# Altium footprint library jointbar.PCBLIB: 166 footprints (part 3 of 11)
Each footprint in its own frame and in the unit in brackets; x right, y up, seen from the top. Pads: shape width x height; smd on the part's side, far side on the other; paste and mask are expansions set on the pad; w line width, h text height; cw(c..) or ccw(c..) is an arc to the next point about the centre after c.
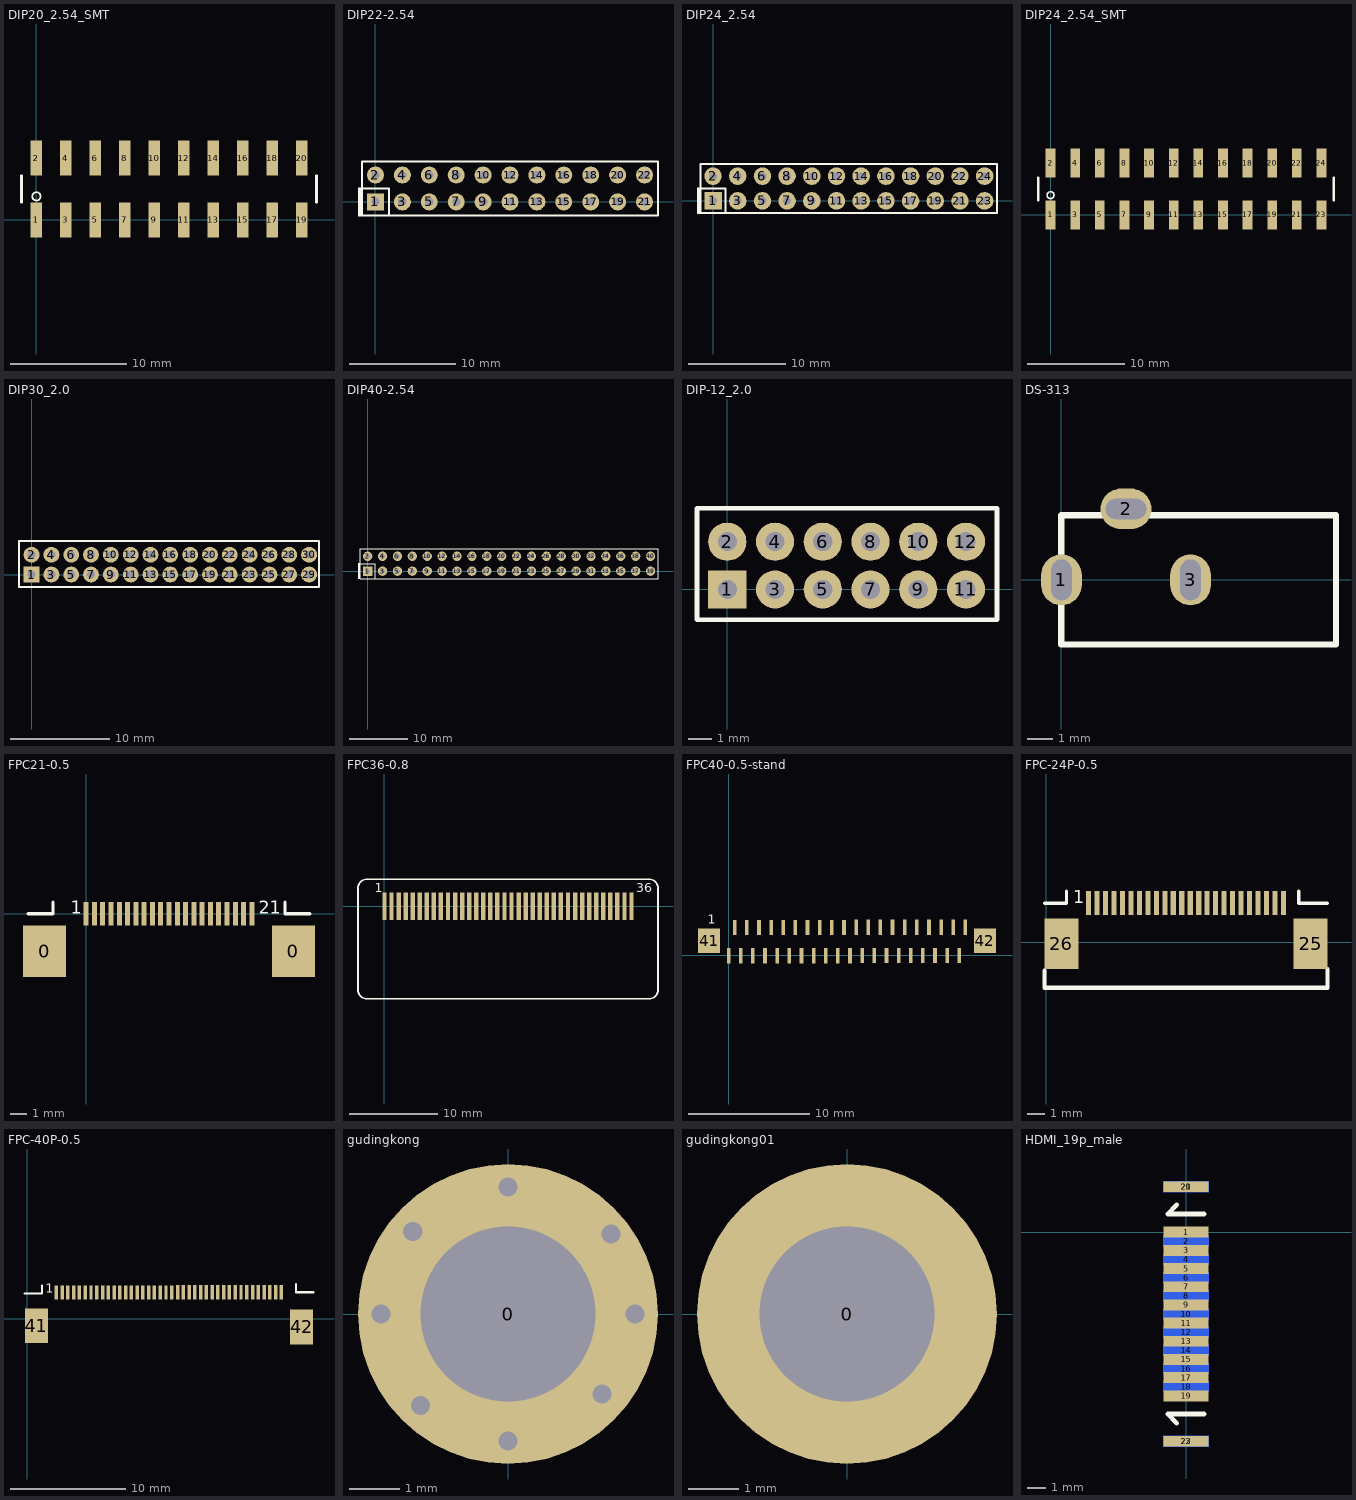
[diagram p2: the footprints below, top view; thin cyan lines are the x and y axes]

## DIP20_2.54_SMT [mm]
pads (20):
  rect 1x3 smd: 1(0,0) 2(0,5.334) 3(2.54,0) 4(2.54,5.334) 5(5.08,0) 6(5.08,5.334) 7(7.62,0) 8(7.62,5.334) 9(10.16,0) 10(10.16,5.334) 11(12.7,0) 12(12.7,5.334) 13(15.24,0) 14(15.24,5.334) 15(17.78,0) 16(17.78,5.334) 17(20.32,0) 18(20.32,5.334) 19(22.86,0) 20(22.86,5.334)
TopOverlay:
  circle w0.152: c0,2.032 r0.359
  lines w0.254: -1.27,1.524 -1.27,3.81 ; 24.13,1.524 24.13,3.81

## DIP22-2.54 [mm]
pads (22):
  rect 1.6x1.6 hole 0.8: 1(0,0)
  round 1.6 hole 0.8: 2(0,2.54) 3(2.54,0) 4(2.54,2.54) 5(5.08,0) 6(5.08,2.54) 7(7.62,0) 8(7.62,2.54) 9(10.16,0) 10(10.16,2.54) 11(12.7,0) 12(12.7,2.54) 13(15.24,0) 14(15.24,2.54) 15(17.78,0) 16(17.78,2.54) 17(20.32,0) 18(20.32,2.54) 19(22.86,0) 20(22.86,2.54) 21(25.4,0) 22(25.4,2.54)
TopOverlay:
  rectangle: -1.651,-1.372 -1.27,1.372
  lines w0.203: -1.27,1.27 1.27,1.27 1.27,-1.27 ; -1.27,-1.27 -1.27,3.81 26.67,3.81 26.67,-1.27 -1.27,-1.27

## DIP24_2.54 [mm]
pads (24):
  rect 1.8x1.8 hole 0.8: 1(0,0)
  round 1.8 hole 0.8: 2(0,2.54) 3(2.54,0) 4(2.54,2.54) 5(5.08,0) 6(5.08,2.54) 7(7.62,0) 8(7.62,2.54) 9(10.16,0) 10(10.16,2.54) 11(12.7,0) 12(12.7,2.54) 13(15.24,0) 14(15.24,2.54) 15(17.78,0) 16(17.78,2.54) 17(20.32,0) 18(20.32,2.54) 19(22.86,0) 20(22.86,2.54) 21(25.4,0) 22(25.4,2.54) 23(27.94,0) 24(27.94,2.54)
TopOverlay:
  rectangle: -1.651,-1.372 -1.27,1.372
  lines w0.203: -1.27,1.27 1.27,1.27 1.27,-1.27 ; -1.27,-1.27 29.21,-1.27 29.21,3.81 -1.27,3.81 -1.27,-1.27

## DIP24_2.54_SMT [mm]
pads (24):
  rect 1x3 smd: 1(0,0) 2(0,5.334) 3(2.54,0) 4(2.54,5.334) 5(5.08,0) 6(5.08,5.334) 7(7.62,0) 8(7.62,5.334) 9(10.16,0) 10(10.16,5.334) 11(12.7,0) 12(12.7,5.334) 13(15.24,0) 14(15.24,5.334) 15(17.78,0) 16(17.78,5.334) 17(20.32,0) 18(20.32,5.334) 19(22.86,0) 20(22.86,5.334) 21(25.4,0) 22(25.4,5.334) 23(27.94,0) 24(27.94,5.334)
TopOverlay:
  circle w0.152: c0,2.032 r0.359
  lines w0.254: -1.27,1.524 -1.27,3.81 ; 29.21,1.524 29.21,3.81

## DIP30_2.0 [mm]
pads (30):
  rect 1.6x1.6 hole 0.8: 1(0,0)
  round 1.6 hole 0.8: 2(0,2) 3(2,0) 4(2,2) 5(4,0) 6(4,2) 7(6,0) 8(6,2) 9(8,0) 10(8,2) 11(10,0) 12(10,2) 13(12,0) 14(12,2) 15(14,0) 16(14,2) 17(16,0) 18(16,2) 19(18,0) 20(18,2) 21(20,0) 22(20,2) 23(22,0) 24(22,2) 25(24,0) 26(24,2) 27(26,0) 28(26,2) 29(28,0) 30(28,2)
TopOverlay:
  lines w0.203: -1.27,-1.27 29,-1.27 29,3.4 -1.27,3.4 -1.27,-1.27

## DIP40-2.54 [mm]
pads (40):
  rect 1.6x1.6 hole 0.8: 1(0,0)
  round 1.6 hole 0.8: 2(0,2.54) 3(2.54,0) 4(2.54,2.54) 5(5.08,0) 6(5.08,2.54) 7(7.62,0) 8(7.62,2.54) 9(10.16,0) 10(10.16,2.54) 11(12.7,0) 12(12.7,2.54) 13(15.24,0) 14(15.24,2.54) 15(17.78,0) 16(17.78,2.54) 17(20.32,0) 18(20.32,2.54) 19(22.86,0) 20(22.86,2.54) 21(25.4,0) 22(25.4,2.54) 23(27.94,0) 24(27.94,2.54) 25(30.48,0) 26(30.48,2.54) 27(33.02,0) 28(33.02,2.54) 29(35.56,0) 30(35.56,2.54) 31(38.1,0) 32(38.1,2.54) 33(40.64,0) 34(40.64,2.54) 35(43.18,0) 36(43.18,2.54) 37(45.72,0) 38(45.72,2.54) 39(48.26,0) 40(48.26,2.54)
TopOverlay:
  rectangle: -1.651,-1.372 -1.27,1.372
  lines w0.203: -1.27,1.27 1.27,1.27 1.27,-1.27 ; -1.27,-1.27 -1.27,3.81 49.53,3.81 49.53,-1.27 -1.27,-1.27

## DIP-12_2.0 [mm]
pads (12):
  rect 1.6x1.6 hole 0.8: 1(0,0)
  round 1.6 hole 0.8: 2(0,2) 3(2,0) 4(2,2) 5(4,0) 6(4,2) 7(6,0) 8(6,2) 9(8,0) 10(8,2) 11(10,0) 12(10,2)
TopOverlay:
  lines w0.203: -1.27,-1.27 11.3,-1.27 11.3,3.4 -1.27,3.4 -1.27,-1.27

## DS-313 [mm]
pads (3):
  oval 1.6x2 hole 0.8 slot 1.6 at 90 deg: 1(0,0) 3(5.08,0)
  oval 2x1.6 hole 0.8 slot 1.6 at 0 deg: 2(2.54,2.794)
TopOverlay:
  lines w0.254: 0,-2.54 10.8,-2.54 10.8,2.54 0,2.54 0,-2.54

## FPC21-0.5 [mm]
pads (23):
  rect 2.6x3.1 smd: 0(-2.5,-2.25) 0(12.5,-2.25)
  rect 0.3x1.4 smd: 1(0,0) 2(0.5,0) 3(1,0) 4(1.5,0) 5(2,0) 6(2.5,0) 7(3,0) 8(3.5,0) 9(4,0) 10(4.5,0) 11(5,0) 12(5.5,0) 13(6,0) 14(6.5,0) 15(7,0) 16(7.5,0) 17(8,0) 18(8.5,0) 19(9,0) 20(9.5,0) 21(10,0)
TopOverlay:
  lines w0.203: -3.5,0 -2,0 -2,0.7 ; 12,0.7 12,0 13.5,0
  text "21" at 10.414,0 h0.76
  text "1" at -0.914,0 h0.76

## FPC36-0.8 [mm]
pads (36):
  rect 0.5x3.1 smd: 1(0,0) 2(0.8,0) 3(1.6,0) 4(2.4,0) 5(3.2,0) 6(4,0) 7(4.8,0) 8(5.6,0) 9(6.4,0) 10(7.2,0) 11(8,0) 12(8.8,0) 13(9.6,0) 14(10.4,0) 15(11.2,0) 16(12,0) 17(12.8,0) 18(13.6,0) 19(14.4,0) 20(15.2,0) 21(16,0) 22(16.8,0) 23(17.6,0) 24(18.4,0) 25(19.2,0) 26(20,0) 27(20.8,0) 28(21.6,0) 29(22.4,0) 30(23.2,0) 31(24,0) 32(24.8,0) 33(25.6,0) 34(26.4,0) 35(27.2,0) 36(28,0)
TopOverlay:
  lines w0.203: -3,-9.5 ccw(c-2,-9.5) -2,-10.5 30,-10.5 ccw(c30,-9.5) 31,-9.5 31,2.05 ccw(c30,2.05) 30,3.05 -2,3.05 ccw(c-2,2.05) -3,2.05 -3,-9.5
  text "36" at 28.524,1.575 h1.02
  text "1" at -1.092,1.549 h1.02

## FPC40-0.5-stand [mm]
pads (42):
  rect 0.3x1.25 smd: 1(0,-0.025) 2(0.5,2.314) 3(1,-0.025) 4(1.5,2.314) 5(2,-0.025) 6(2.5,2.314) 7(3,-0.025) 8(3.5,2.314) 9(4,-0.025) 10(4.5,2.314) 11(5,-0.025) 12(5.5,2.314) 13(6,-0.025) 14(6.5,2.314) 15(7,-0.025) 16(7.5,2.314) 17(8,-0.025) 18(8.5,2.314) 19(9,-0.025) 20(9.5,2.314) 21(10,-0.025) 22(10.5,2.328) 23(11,-0.011) 24(11.5,2.328) 25(12,-0.011) 26(12.5,2.328) 27(13,-0.011) 28(13.5,2.328) 29(14,-0.011) 30(14.5,2.328) 31(15,-0.011) 32(15.5,2.328) 33(16,-0.011) 34(16.5,2.328) 35(17,-0.011) 36(17.5,2.328) 37(18,-0.011) 38(18.5,2.328) 39(19,-0.011) 40(19.5,2.328)
  rect 1.8x2 smd: 41(-1.6,1.2) 42(21.1,1.2)
TopOverlay:
  text "1" at -1.7,2.6 h0.76

## FPC-24P-0.5 [mm]
pads (26):
  rect 0.3x1.4 smd: 1(2.5,2.3) 2(3,2.3) 3(3.5,2.3) 4(4,2.3) 5(4.5,2.3) 6(5,2.3) 7(5.5,2.3) 8(6,2.3) 9(6.5,2.3) 10(7,2.3) 11(7.5,2.3) 12(8,2.3) 13(8.5,2.3) 14(9,2.3) 15(9.5,2.3) 16(10,2.3) 17(10.5,2.3) 18(11,2.3) 19(11.5,2.3) 20(12,2.3) 21(12.5,2.3) 22(13,2.3) 23(13.5,2.3) 24(14,2.3)
  rect 2x3 smd: 25(15.6,-0.1) 26(0.9,-0.1)
TopOverlay:
  lines w0.203: -0.1,2.3 1.2,2.3 1.2,3 ; 14.9,3 14.9,2.3 16.6,2.3
  lines w0.254: -0.1,-1.7 -0.1,-2.7 16.6,-2.7 16.6,-1.6
  text "1" at 1.586,2.3 h0.76
3D body "33944.STEP": height 2, standoff 0, extent 0.195,-2.864 16.295,3.036

## FPC-40P-0.5 [mm]
pads (42):
  rect 0.3x1.25 smd: 1(2.54,2.286) 2(3.04,2.286) 3(3.54,2.286) 4(4.04,2.286) 5(4.54,2.286) 6(5.04,2.286) 7(5.54,2.286) 8(6.04,2.286) 9(6.54,2.286) 10(7.04,2.286) 11(7.54,2.286) 12(8.04,2.286) 13(8.54,2.286) 14(9.04,2.286) 15(9.54,2.286) 16(10.04,2.286) 17(10.54,2.286) 18(11.04,2.286) 19(11.54,2.286) 20(12.04,2.286) 21(12.54,2.286) 22(13.04,2.3) 23(13.54,2.3) 24(14.04,2.3) 25(14.54,2.3) 26(15.04,2.3) 27(15.54,2.3) 28(16.04,2.3) 29(16.54,2.3) 30(17.04,2.3) 31(17.54,2.3) 32(18.04,2.3) 33(18.54,2.3) 34(19.04,2.3) 35(19.54,2.3) 36(20.04,2.3) 37(20.54,2.3) 38(21.04,2.3) 39(21.54,2.3) 40(22.04,2.3)
  rect 2x3 smd: 41(0.8,-0.6) 42(23.8,-0.7)
TopOverlay:
  lines w0.203: -0.2,2.2 1.3,2.2 1.3,2.9 ; 23.3,3 23.3,2.3 24.8,2.3
  text "1" at 1.626,2.286 h0.76
3D body "70804.stp": height 2.21, standoff 0.15, extent -0.431,-2.627 25.069,3.013

## gudingkong [mm]
pads (1):
  round 6 hole 3.5: 0(0,0)
via 0,2.54 diameter 0.762 hole 0.381
via 0,-2.54 diameter 0.762 hole 0.381
via -2.54,0 diameter 0.762 hole 0.381
via 2.54,0 diameter 0.762 hole 0.381
via -1.905,1.651 diameter 0.762 hole 0.381
via 2.057,1.6 diameter 0.762 hole 0.381
via -1.753,-1.829 diameter 0.762 hole 0.381
via 1.88,-1.6 diameter 0.762 hole 0.381

## gudingkong01 [mm]
pads (1):
  round 6 hole 3.5: 0(0,0)

## HDMI_19p_male [mm]
pads (23):
  rect 2.5x0.6 smd: 1(0,0) 3(0,-1) 5(0,-2) 7(0,-3) 9(0,-4) 11(0,-5) 13(0,-6) 15(0,-7) 17(0,-8) 19(0,-9) 21(0,2.5) 23(0,-11.5)
  rect 2.5x0.6 smd far side: 2(0,-0.5) 4(0,-1.5) 6(0,-2.5) 8(0,-3.5) 10(0,-4.5) 12(0,-5.5) 14(0,-6.5) 16(0,-7.5) 18(0,-8.5) 20(0,2.5) 22(0,-11.5)
TopOverlay:
  lines w0.254: -0.5,-10.5 -1,-10 1,-10 ; -0.5,1.5 -1,1 1,1
3D body "User Library-3067-20010002R-Rev_01.STEP": height 2.47, standoff -2.47, extent -15.3,-11.95 2,2.95